# Altium footprint library ref-packages-longpad.PCBLIB: 1527 footprints (part 27 of 103)
Each footprint in its own frame and in the unit in brackets; x right, y up, seen from the top. Pads: shape width x height; smd on the part's side, far side on the other; paste and mask are expansions set on the pad; w line width, h text height; cw(c..) or ccw(c..) is an arc to the next point about the centre after c.
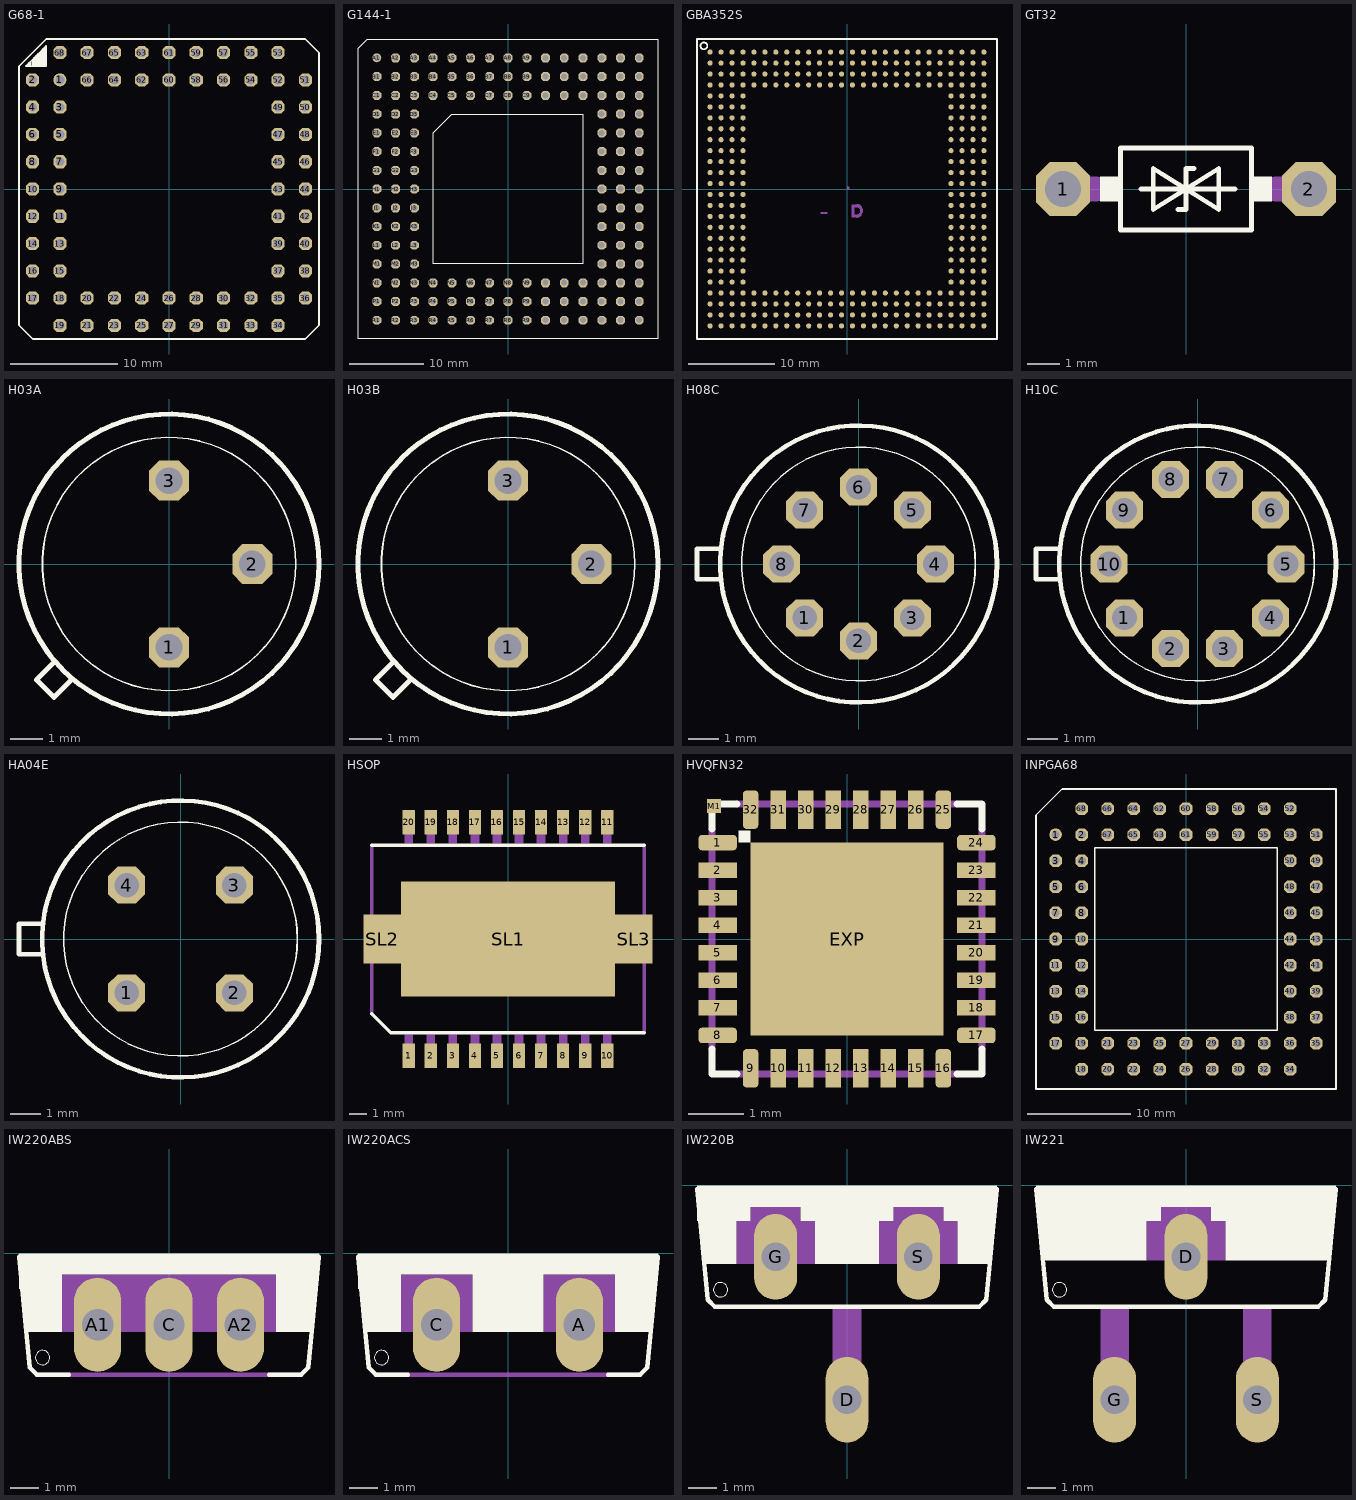
[diagram p26: the footprints below, top view; thin cyan lines are the x and y axes]

## G68-1 [mil]
pads (68):
  round 48 hole 32: 1(-400,400)
  oct 48x48 hole 32: 2(-500,400) 3(-400,300) 4(-500,300) 5(-400,200) 6(-500,200) 7(-400,100) 8(-500,100) 9(-400,0) 10(-500,0) 11(-400,-100) 12(-500,-100) 13(-400,-200) 14(-500,-200) 15(-400,-300) 16(-500,-300) 17(-500,-400) 18(-400,-400) 19(-400,-500) 20(-300,-400) 21(-300,-500) 22(-200,-400) 23(-200,-500) 24(-100,-400) 25(-100,-500) 26(0,-400) 27(0,-500) 28(100,-400) 29(100,-500) 30(200,-400) 31(200,-500) 32(300,-400) 33(300,-500) 34(400,-500) 35(400,-400) 36(500,-400) 37(400,-300) 38(500,-300) 39(400,-200) 40(500,-200) 41(400,-100) 42(500,-100) 43(400,0) 44(500,0) 45(400,100) 46(500,100) 47(400,200) 48(500,200) 49(400,300) 50(500,300) 51(500,400) 52(400,400) 53(400,500) 54(300,400) 55(300,500) 56(200,400) 57(200,500) 58(100,400) 59(100,500) 60(0,400) 61(0,500) 62(-100,400) 63(-100,500) 64(-200,400) 65(-200,500) 66(-300,400) 67(-300,500) 68(-400,500)
Top Overlay:
  lines w6: -518.74,450 -512.5,450 ; -518.74,450 -525,450 -518.74,456.26 ; -518.74,450 -518.74,456.26 ; -518.74,456.26 -512.5,462.5 ; -512.5,450 -506.26,450 ; -512.5,450 -512.5,462.5 ; -512.5,462.5 -506.26,468.74 ; -506.26,450 -500,450 ; -506.26,450 -506.26,468.74 ; -506.26,468.74 -500,475 ; -500,450 -493.74,450 ; -500,450 -500,475 ; -500,475 -493.74,481.26 ; -493.74,450 -487.5,450 ; -493.74,450 -493.74,481.26 ; -493.74,481.26 -487.5,487.5 ; -487.5,450 -481.26,450 ; -487.5,450 -487.5,487.5 ; -487.5,487.5 -481.26,493.74 ; -481.26,450 -475,450 ; -481.26,450 -481.26,493.74 ; -481.26,493.74 -475,500 ; -475,450 -468.74,450 ; -475,450 -475,500 ; -475,500 -468.74,506.26 ; -468.74,450 -462.5,450 ; -468.74,450 -468.74,506.26 ; -468.74,506.26 -462.5,512.5 ; -462.5,450 -456.26,450 ; -462.5,450 -462.5,512.5 ; -462.5,512.5 -456.26,518.74 ; -456.26,450 -450,450 -450,525 -456.26,518.74 ; -456.26,450 -456.26,518.74 ; -550,-500 -500,-550 500,-550 550,-500 550,500 500,550 -450,550 -550,450 -550,-500

## G144-1 [mil]
pads (144):
  round 48 hole 32: A1(-700,700)
  oct 48x48 hole 32: A2(-600,700) A3(-500,700) A4(-400,700) A5(-300,700) A6(-200,700) A7(-100,700) A8(0,700) A9(100,700) A10(200,700) A11(300,700) A12(400,700) A13(500,700) A14(600,700) A15(700,700) B1(-700,600) B2(-600,600) B3(-500,600) B4(-400,600) B5(-300,600) B6(-200,600) B7(-100,600) B8(0,600) B9(100,600) B10(200,600) B11(300,600) B12(400,600) B13(500,600) B14(600,600) B15(700,600) C1(-700,500) C2(-600,500) C3(-500,500) C4(-400,500) C5(-300,500) C6(-200,500) C7(-100,500) C8(0,500) C9(100,500) C10(200,500) C11(300,500) C12(400,500) C13(500,500) C14(600,500) C15(700,500) D1(-700,400) D2(-600,400) D3(-500,400) D13(500,400) D14(600,400) D15(700,400) E1(-700,300) E2(-600,300) E3(-500,300) E13(500,300) E14(600,300) E15(700,300) F1(-700,200) F2(-600,200) F3(-500,200) F13(500,200) F14(600,200) F15(700,200) G1(-700,100) G2(-600,100) G3(-500,100) G13(500,100) G14(600,100) G15(700,100) H1(-700,0) H2(-600,0) H3(-500,0) H13(500,0) H14(600,0) H15(700,0) J1(-700,-100) J2(-600,-100) J3(-500,-100) J13(500,-100) J14(600,-100) J15(700,-100) K1(-700,-200) K2(-600,-200) K3(-500,-200) K13(500,-200) K14(600,-200) K15(700,-200) L1(-700,-300) L2(-600,-300) L3(-500,-300) L13(500,-300) L14(600,-300) L15(700,-300) M1(-700,-400) M2(-600,-400) M3(-500,-400) M13(500,-400) M14(600,-400) M15(700,-400) N1(-700,-500) N2(-600,-500) N3(-500,-500) N4(-400,-500) N5(-300,-500) N6(-200,-500) N7(-100,-500) N8(0,-500) N9(100,-500) N10(200,-500) N11(300,-500) N12(400,-500) N13(500,-500) N14(600,-500) N15(700,-500) P1(-700,-600) P2(-600,-600) P3(-500,-600) P4(-400,-600) P5(-300,-600) P6(-200,-600) P7(-100,-600) P8(0,-600) P9(100,-600) P10(200,-600) P11(300,-600) P12(400,-600) P13(500,-600) P14(600,-600) P15(700,-600) R1(-700,-700) R2(-600,-700) R3(-500,-700) R4(-400,-700) R5(-300,-700) R6(-200,-700) R7(-100,-700) R8(0,-700) R9(100,-700) R10(200,-700) R11(300,-700) R12(400,-700) R13(500,-700) R14(600,-700) R15(700,-700)
Top Overlay:
  lines w6: -800,-800 800,-800 800,800 -750,800 -800,750 -800,-800 ; -400,-400 400,-400 400,400 -300,400 -400,300 -400,-400

## GBA352S [mil]
pads (352):
  rrect100% 23.62x23.62 smd: A1(-625,625) A2(-575,625) A3(-525,625) A4(-475,625) A5(-425,625) A6(-375,625) A7(-325,625) A8(-275,625) A9(-225,625) A10(-175,625) A11(-125,625) A12(-75,625) A13(-25,625) A14(25,625) A15(75,625) A16(125,625) A17(175,625) A18(225,625) A19(275,625) A20(325,625) A21(375,625) A22(425,625) A23(475,625) A24(525,625) A25(575,625) A26(625,625) AA1(-625,-375) AA2(-575,-375) AA3(-525,-375) AA4(-475,-375) AA23(475,-375) AA24(525,-375) AA25(575,-375) AA26(625,-375) AB1(-625,-425) AB2(-575,-425) AB3(-525,-425) AB4(-475,-425) AB23(475,-425) AB24(525,-425) AB25(575,-425) AB26(625,-425) AC1(-625,-475) AC2(-575,-475) AC3(-525,-475) AC4(-475,-475) AC5(-425,-475) AC6(-375,-475) AC7(-325,-475) AC8(-275,-475) AC9(-225,-475) AC10(-175,-475) AC11(-125,-475) AC12(-75,-475) AC13(-25,-475) AC14(25,-475) AC15(75,-475) AC16(125,-475) AC17(175,-475) AC18(225,-475) AC19(275,-475) AC20(325,-475) AC21(375,-475) AC22(425,-475) AC23(475,-475) AC24(525,-475) AC25(575,-475) AC26(625,-475) AD1(-625,-525) AD2(-575,-525) AD3(-525,-525) AD4(-475,-525) AD5(-425,-525) AD6(-375,-525) AD7(-325,-525) AD8(-275,-525) AD9(-225,-525) AD10(-175,-525) AD11(-125,-525) AD12(-75,-525) AD13(-25,-525) AD14(25,-525) AD15(75,-525) AD16(125,-525) AD17(175,-525) AD18(225,-525) AD19(275,-525) AD20(325,-525) AD21(375,-525) AD22(425,-525) AD23(475,-525) AD24(525,-525) AD25(575,-525) AD26(625,-525) AE1(-625,-575) AE2(-575,-575) AE3(-525,-575) AE4(-475,-575) AE5(-425,-575) AE6(-375,-575) AE7(-325,-575) AE8(-275,-575) AE9(-225,-575) AE10(-175,-575) AE11(-125,-575) AE12(-75,-575) AE13(-25,-575) AE14(25,-575) AE15(75,-575) AE16(125,-575) AE17(175,-575) AE18(225,-575) AE19(275,-575) AE20(325,-575) AE21(375,-575) AE22(425,-575) AE23(475,-575) AE24(525,-575) AE25(575,-575) AE26(625,-575) AF1(-625,-625) AF2(-575,-625) AF3(-525,-625) AF4(-475,-625) AF5(-425,-625) AF6(-375,-625) AF7(-325,-625) AF8(-275,-625) AF9(-225,-625) AF10(-175,-625) AF11(-125,-625) AF12(-75,-625) AF13(-25,-625) AF14(25,-625) AF15(75,-625) AF16(125,-625) AF17(175,-625) AF18(225,-625) AF19(275,-625) AF20(325,-625) AF21(375,-625) AF22(425,-625) AF23(475,-625) AF24(525,-625) AF25(575,-625) AF26(625,-625) B1(-625,575) B2(-575,575) B3(-525,575) B4(-475,575) B5(-425,575) B6(-375,575) B7(-325,575) B8(-275,575) B9(-225,575) B10(-175,575) B11(-125,575) B12(-75,575) B13(-25,575) B14(25,575) B15(75,575) B16(125,575) B17(175,575) B18(225,575) B19(275,575) B20(325,575) B21(375,575) B22(425,575) B23(475,575) B24(525,575) B25(575,575) B26(625,575) C1(-625,525) C2(-575,525) C3(-525,525) C4(-475,525) C5(-425,525) C6(-375,525) C7(-325,525) C8(-275,525) C9(-225,525) C10(-175,525) C11(-125,525) C12(-75,525) C13(-25,525) C14(25,525) C15(75,525) C16(125,525) C17(175,525) C18(225,525) C19(275,525) C20(325,525) C21(375,525) C22(425,525) C23(475,525) C24(525,525) C25(575,525) C26(625,525) D1(-625,475) D2(-575,475) D3(-525,475) D4(-475,475) D5(-425,475) D6(-375,475) D7(-325,475) D8(-275,475) D9(-225,475) D10(-175,475) D11(-125,475) D12(-75,475) D13(-25,475) D14(25,475) D15(75,475) D16(125,475) D17(175,475) D18(225,475) D19(275,475) D20(325,475) D21(375,475) D22(425,475) D23(475,475) D24(525,475) D25(575,475) D26(625,475) E1(-625,425) E2(-575,425) E3(-525,425) E4(-475,425) E23(475,425) E24(525,425) E25(575,425) E26(625,425) F1(-625,375) F2(-575,375) F3(-525,375) F4(-475,375) F23(475,375) F24(525,375) F25(575,375) F26(625,375) G1(-625,325) G2(-575,325) G3(-525,325) G4(-475,325) G23(475,325) G24(525,325) G25(575,325) G26(625,325) H1(-625,275) H2(-575,275) H3(-525,275) H4(-475,275) H23(475,275) H24(525,275) H25(575,275) H26(625,275) J1(-625,225) J2(-575,225) J3(-525,225) J4(-475,225) J23(475,225) J24(525,225) J25(575,225) J26(625,225) K1(-625,175) K2(-575,175) K3(-525,175) K4(-475,175) K23(475,175) K24(525,175) K25(575,175) K26(625,175) L1(-625,125) L2(-575,125) L3(-525,125) L4(-475,125) L23(475,125) L24(525,125) L25(575,125) L26(625,125) M1(-625,75) M2(-575,75) M3(-525,75) M4(-475,75) M23(475,75) M24(525,75) M25(575,75) M26(625,75) N1(-625,25) N2(-575,25) N3(-525,25) N4(-475,25) N23(475,25) N24(525,25) N25(575,25) N26(625,25) P1(-625,-25) P2(-575,-25) P3(-525,-25) P4(-475,-25) P23(475,-25) P24(525,-25) P25(575,-25) P26(625,-25) R1(-625,-75) R2(-575,-75) R3(-525,-75) R4(-475,-75) R23(475,-75) R24(525,-75) R25(575,-75) R26(625,-75) T1(-625,-125) T2(-575,-125) T3(-525,-125) T4(-475,-125) T23(475,-125) T24(525,-125) T25(575,-125) T26(625,-125) U1(-625,-175) U2(-575,-175) U3(-525,-175) U4(-475,-175) U23(475,-175) U24(525,-175) U25(575,-175) U26(625,-175) V1(-625,-225) V2(-575,-225) V3(-525,-225) V4(-475,-225) V23(475,-225) V24(525,-225) V25(575,-225) V26(625,-225) W1(-625,-275) W2(-575,-275) W3(-525,-275) W4(-475,-275) W23(475,-275) W24(525,-275) W25(575,-275) W26(625,-275) Y1(-625,-325) Y2(-575,-325) Y3(-525,-325) Y4(-475,-325) Y23(475,-325) Y24(525,-325) Y25(575,-325) Y26(625,-325)
Top Overlay:
  circle w8: c-653.54,653.54 r15.74
  lines w8: -685.04,-685.04 -685.04,685.04 685.04,685.04 685.04,-685.04 -685.04,-685.04
Mechanical 16:
  rectangle: 23,-84 45,-70
  rectangle: 23,-130 45,-116
  rectangle: -120,-115 -90,-105
  rectangle: 20,-130 35,-70
  region: 0,0 10,0 10,10 0,10
  region: 0,0 10,0 10,10 0,10
  region: 0,0 10,0 10,10 0,10
  region: 0,0 10,0 10,10 0,10
  region: 0,0 10,0 10,10 0,10
  region: 0,0 10,0 10,10 0,10
  lines w2: 44,-129 ccw(c44,-100) 44,-71
  lines w8: 44,-125 ccw(c44,-100) 44,-75
  lines w10: 44,-121 ccw(c44,-100) 44,-79
  text "BGA352" at -85.63,-253.74 h49.6

## GT32 [mil]
pads (2):
  oct 66x66 hole 44: 1(-150,0) 2(150,0)
Top Overlay:
  rectangle: 80,-15 105,15
  rectangle: -105,-15 -80,15
  lines w6: -55,0 0,0 ; -10,-25 0,-25 0,0 ; 10,25 0,25 0,0 ; 60,0 0,0 ; 0,0 40,-25 40,25 0,0 ; 0,0 -40,25 -40,-25 0,0 ; -80,-50 80,-50 80,50 -80,50 -80,-50
Mechanical 16:
  lines w30: -150,0 -110,0 ; 110,0 150,0

## H03A [mil]
pads (3):
  oct 48x48 hole 32: 1(0,-100) 2(100,0) 3(0,100)
Top Overlay:
  circle w6: c0,0 r180
  circle w2: c0,0 r152
  lines w6: -138,-118 -159,-139 -138,-160 -117,-139

## H03B [mil]
pads (3):
  oct 48x48 hole 32: 1(0,-100) 2(100,0) 3(0,100)
Top Overlay:
  circle w6: c0,0 r180
  circle w2: c0,0 r152
  lines w6: -138,-118 -159,-139 -138,-160 -117,-139

## H08C [mil]
pads (8):
  oct 48x48 hole 32: 1(-70,-70) 2(0,-100) 3(70,-70) 4(100,0) 5(70,70) 6(0,100) 7(-70,70) 8(-100,0)
Top Overlay:
  circle w6: c0,0 r180
  circle w2: c0,0 r152
  lines w6: -180,-20 -210,-20 -210,20 -180,20

## H10C [mil]
pads (10):
  oct 48x48 hole 32: 1(-95,-70) 2(-35,-110) 3(35,-110) 4(95,-70) 5(115,0) 6(95,70) 7(35,110) 8(-35,110) 9(-95,70) 10(-115,0)
Top Overlay:
  circle w6: c0,0 r180
  circle w2: c0,0 r152
  lines w6: -180,-20 -210,-20 -210,20 -180,20

## HA04E [mil]
pads (4):
  oct 48x48 hole 32: 1(-70,-70) 2(70,-70) 3(70,70) 4(-70,70)
Top Overlay:
  circle w6: c0,0 r180
  circle w2: c0,0 r152
  lines w6: -180,-20 -210,-20 -210,20 -180,20

## HSOP [mil]
pads (23):
  rect 27.56x55.12 smd: 1(-225,-265) 2(-175,-265) 3(-125,-265) 4(-75,-265) 5(-25,-265) 6(25,-265) 7(75,-265) 8(125,-265) 9(175,-265) 10(225,-265) 11(225,265) 12(175,265) 13(125,265) 14(75,265) 15(25,265) 16(-25,265) 17(-75,265) 18(-125,265) 19(-175,265) 20(-225,265)
  rect 486.22x259.84 smd: SL1(0,0)
  rect 84.65x110.24 smd: SL2(-285,0) SL3(285,0)
Top Overlay:
  lines w8: -309.06,-169.29 -265.75,-212.6 309.06,-212.6 ; -309.06,212.6 309.06,212.6
Mechanical 16:
  rectangle: -234.84,-279.53 -215.16,-216.54
  rectangle: -184.84,-279.53 -165.16,-216.54
  rectangle: -134.84,-279.53 -115.16,-216.54
  rectangle: -84.84,-279.53 -65.16,-216.54
  rectangle: -34.84,-279.53 -15.16,-216.54
  rectangle: 15.16,-279.53 34.84,-216.54
  rectangle: 65.16,-279.53 84.84,-216.54
  rectangle: 115.16,-279.53 134.84,-216.54
  rectangle: 165.16,-279.53 184.84,-216.54
  rectangle: 215.16,-279.53 234.84,-216.54
  region: 234.84,279.53 215.16,279.53 215.16,216.54 234.84,216.54
  region: 184.84,279.53 165.16,279.53 165.16,216.54 184.84,216.54
  region: 134.84,279.53 115.16,279.53 115.16,216.54 134.84,216.54
  region: 84.84,279.53 65.16,279.53 65.16,216.54 84.84,216.54
  region: 34.84,279.53 15.16,279.53 15.16,216.54 34.84,216.54
  region: -15.16,279.53 -34.84,279.53 -34.84,216.54 -15.16,216.54
  region: -65.16,279.53 -84.84,279.53 -84.84,216.54 -65.16,216.54
  region: -115.16,279.53 -134.84,279.53 -134.84,216.54 -115.16,216.54
  region: -165.16,279.53 -184.84,279.53 -184.84,216.54 -165.16,216.54
  region: -215.16,279.53 -234.84,279.53 -234.84,216.54 -215.16,216.54
  lines w8: -309.06,-169.29 -309.06,212.6 ; 309.06,-212.6 309.06,212.6

## HVQFN32 [mm]
pads (34):
  rrect50% 0.7x0.28 smd: 1(-2.35,1.75) 8(-2.35,-1.75) 17(2.35,-1.75) 24(2.35,1.75)
  rect 0.7x0.28 smd: 2(-2.35,1.25) 3(-2.35,0.75) 4(-2.35,0.25) 5(-2.35,-0.25) 6(-2.35,-0.75) 7(-2.35,-1.25) 18(2.35,-1.25) 19(2.35,-0.75) 20(2.35,-0.25) 21(2.35,0.25) 22(2.35,0.75) 23(2.35,1.25)
  rrect50% 0.28x0.7 smd: 9(-1.75,-2.35) 16(1.75,-2.35) 25(1.75,2.35) 32(-1.75,2.35)
  rect 0.28x0.7 smd: 10(-1.25,-2.35) 11(-0.75,-2.35) 12(-0.25,-2.35) 13(0.25,-2.35) 14(0.75,-2.35) 15(1.25,-2.35) 26(1.25,2.35) 27(0.75,2.35) 28(0.25,2.35) 29(-0.25,2.35) 30(-0.75,2.35) 31(-1.25,2.35)
  rect 3.5x3.5 smd: EXP(0,0)
  rect 0.25x0.25 smd: M1(-2.415,2.415)
Top Overlay:
  rectangle: -1.975,1.75 -1.75,1.975
  lines w0.127: -2.45,-2 -2.45,-2.45 -2,-2.45 ; -2.45,2 -2.45,2.45 -2,2.45 ; 2,-2.45 2.45,-2.45 2.45,-2 ; 2,2.45 2.45,2.45 2.45,2
Top Solder:
  rectangle: -1.75,-1.75 1.75,1.75
  rectangle: -2.725,1.575 -1.975,1.925
  rectangle: -2.725,1.075 -1.975,1.425
  rectangle: -2.725,0.575 -1.975,0.925
  rectangle: -2.725,0.075 -1.975,0.425
  rectangle: -2.725,-0.425 -1.975,-0.075
  rectangle: -2.725,-0.925 -1.975,-0.575
  rectangle: -2.725,-1.425 -1.975,-1.075
  rectangle: -2.725,-1.925 -1.975,-1.575
  region: -1.575,-2.725 -1.575,-1.975 -1.925,-1.975 -1.925,-2.725
  region: -1.075,-2.725 -1.075,-1.975 -1.425,-1.975 -1.425,-2.725
  region: -0.575,-2.725 -0.575,-1.975 -0.925,-1.975 -0.925,-2.725
  region: -0.075,-2.725 -0.075,-1.975 -0.425,-1.975 -0.425,-2.725
  region: 0.425,-2.725 0.425,-1.975 0.075,-1.975 0.075,-2.725
  region: 0.925,-2.725 0.925,-1.975 0.575,-1.975 0.575,-2.725
  region: 1.425,-2.725 1.425,-1.975 1.075,-1.975 1.075,-2.725
  region: 1.925,-2.725 1.925,-1.975 1.575,-1.975 1.575,-2.725
  region: 2.725,-1.575 1.975,-1.575 1.975,-1.925 2.725,-1.925
  region: 2.725,-1.075 1.975,-1.075 1.975,-1.425 2.725,-1.425
  region: 2.725,-0.575 1.975,-0.575 1.975,-0.925 2.725,-0.925
  region: 2.725,-0.075 1.975,-0.075 1.975,-0.425 2.725,-0.425
  region: 2.725,0.425 1.975,0.425 1.975,0.075 2.725,0.075
  region: 2.725,0.925 1.975,0.925 1.975,0.575 2.725,0.575
  region: 2.725,1.425 1.975,1.425 1.975,1.075 2.725,1.075
  region: 2.725,1.925 1.975,1.925 1.975,1.575 2.725,1.575
  region: 1.575,2.725 1.575,1.975 1.925,1.975 1.925,2.725
  region: 1.075,2.725 1.075,1.975 1.425,1.975 1.425,2.725
  region: 0.575,2.725 0.575,1.975 0.925,1.975 0.925,2.725
  region: 0.075,2.725 0.075,1.975 0.425,1.975 0.425,2.725
  region: -0.425,2.725 -0.425,1.975 -0.075,1.975 -0.075,2.725
  region: -0.925,2.725 -0.925,1.975 -0.575,1.975 -0.575,2.725
  region: -1.425,2.725 -1.425,1.975 -1.075,1.975 -1.075,2.725
  region: -1.925,2.725 -1.925,1.975 -1.575,1.975 -1.575,2.725
Mechanical 16:
  lines w0.127: -2.45,-2 -2.45,2 ; -2,-2.45 2,-2.45 ; -2,2.45 2,2.45 ; 2.45,-2 2.45,2

## INPGA68 [mil]
pads (68):
  round 48 hole 32: 1(-500,400)
  oct 48x48 hole 32: 2(-400,400) 3(-500,300) 4(-400,300) 5(-500,200) 6(-400,200) 7(-500,100) 8(-400,100) 9(-500,0) 10(-400,0) 11(-500,-100) 12(-400,-100) 13(-500,-200) 14(-400,-200) 15(-500,-300) 16(-400,-300) 17(-500,-400) 18(-400,-500) 19(-400,-400) 20(-300,-500) 21(-300,-400) 22(-200,-500) 23(-200,-400) 24(-100,-500) 25(-100,-400) 26(0,-500) 27(0,-400) 28(100,-500) 29(100,-400) 30(200,-500) 31(200,-400) 32(300,-500) 33(300,-400) 34(400,-500) 35(500,-400) 36(400,-400) 37(500,-300) 38(400,-300) 39(500,-200) 40(400,-200) 41(500,-100) 42(400,-100) 43(500,0) 44(400,0) 45(500,100) 46(400,100) 47(500,200) 48(400,200) 49(500,300) 50(400,300) 51(500,400) 52(400,500) 53(400,400) 54(300,500) 55(300,400) 56(200,500) 57(200,400) 58(100,500) 59(100,400) 60(0,500) 61(0,400) 62(-100,500) 63(-100,400) 64(-200,500) 65(-200,400) 66(-300,500) 67(-300,400) 68(-400,500)
Top Overlay:
  lines w6: -575,-575 575,-575 575,575 -475,575 -575,475 -575,-575 ; -350,-350 -350,350 350,350 350,-350 -350,-350

## IW220ABS [mil]
pads (3):
  oval 66x132 hole 44: A1(-100,-100) A2(100,-100) C(0,-100)
Top Overlay:
  circle w0: c-177,-146 r10
  rectangle: -210,-30 210,0
  rectangle: -210,-50 -150,-25
  rectangle: 150,-50 205,-30
  rectangle: 200,-75 205,-50
  rectangle: -205,-75 -200,-50
  rectangle: 150,-110 200,-50
  rectangle: -200,-110 -150,-50
  lines w6: -210,-5 -195,-160 -185,-170 -140,-170 ; 140,-170 185,-170 195,-160 210,-5
Mechanical 16:
  rectangle: -150,-110 150,-30
  lines w6: -185,-170 185,-170

## IW220ACS [mil]
pads (2):
  oval 66x132 hole 44: A(100,-100) C(-100,-100)
Top Overlay:
  circle w0: c-177,-146 r10
  rectangle: -210,-30 210,0
  rectangle: -210,-50 -150,-30
  rectangle: -50,-50 50,-30
  rectangle: 150,-110 200,-50
  rectangle: 150,-50 205,-30
  rectangle: 200,-75 205,-50
  rectangle: -50,-110 50,-50
  rectangle: -200,-110 -150,-50
  rectangle: -205,-75 -200,-50
  lines w6: -210,-5 -195,-160 -185,-170 -140,-170 ; 140,-170 185,-170 195,-160 210,-5
Mechanical 16:
  rectangle: -150,-50 -50,-30
  rectangle: 50,-50 150,-30
  rectangle: 50,-110 150,-50
  rectangle: -150,-110 -50,-50
  lines w6: -185,-170 185,-170

## IW220B [mil]
pads (3):
  oval 60x120 hole 40: D(0,-300) G(-100,-100) S(100,-100)
Top Overlay:
  circle w0: c-177,-146 r10
  rectangle: -210,-30 210,0
  rectangle: -210,-50 -135,-30
  rectangle: -65,-50 65,-30
  rectangle: 155,-110 200,-50
  rectangle: 135,-50 205,-30
  rectangle: 200,-75 205,-50
  rectangle: -45,-110 45,-50
  rectangle: -200,-110 -155,-50
  rectangle: -205,-75 -200,-50
  lines w6: -210,-5 -195,-160 -185,-170 185,-170 195,-160 210,-5
Mechanical 16:
  rectangle: -135,-50 -65,-30
  rectangle: 65,-50 135,-30
  rectangle: -20,-300 20,-245
  rectangle: -20,-245 20,-170
  rectangle: 45,-110 155,-50
  rectangle: -155,-110 -45,-50
  text "G" at -120,-160 h62
  text "D" at -15,-160 h62
  text "S" at 80,-160 h62

## IW221 [mil]
pads (3):
  oval 60x120 hole 40: D(0,-100) G(-100,-300) S(100,-300)
Top Overlay:
  circle w0: c-177,-146 r10
  rectangle: -210,-30 210,0
  rectangle: 35,-50 205,-30
  rectangle: 55,-105 200,-50
  rectangle: -200,-105 -55,-50
  rectangle: -205,-50 -35,-30
  rectangle: 200,-80 205,-50
  rectangle: -205,-80 -200,-50
  lines w6: -210,-5 -195,-160 -185,-170 185,-170 195,-160 210,-5
Mechanical 16:
  rectangle: -35,-50 35,-30
  rectangle: -120,-300 -80,-245
  rectangle: 80,-300 120,-245
  rectangle: -120,-245 -80,-170
  rectangle: 80,-245 120,-170
  rectangle: -55,-105 55,-50
  text "G" at -125,-160 h62
  text "D" at -15,-160 h62
  text "S" at 80,-160 h62